# Altium footprint library ICs And Semiconductors SMD.PcbLib: 943 footprints (part 14 of 60)
Each footprint in its own frame and in the unit in brackets; x right, y up, seen from the top. Pads: shape width x height; smd on the part's side, far side on the other; paste and mask are expansions set on the pad; w line width, h text height; cw(c..) or ccw(c..) is an arc to the next point about the centre after c.
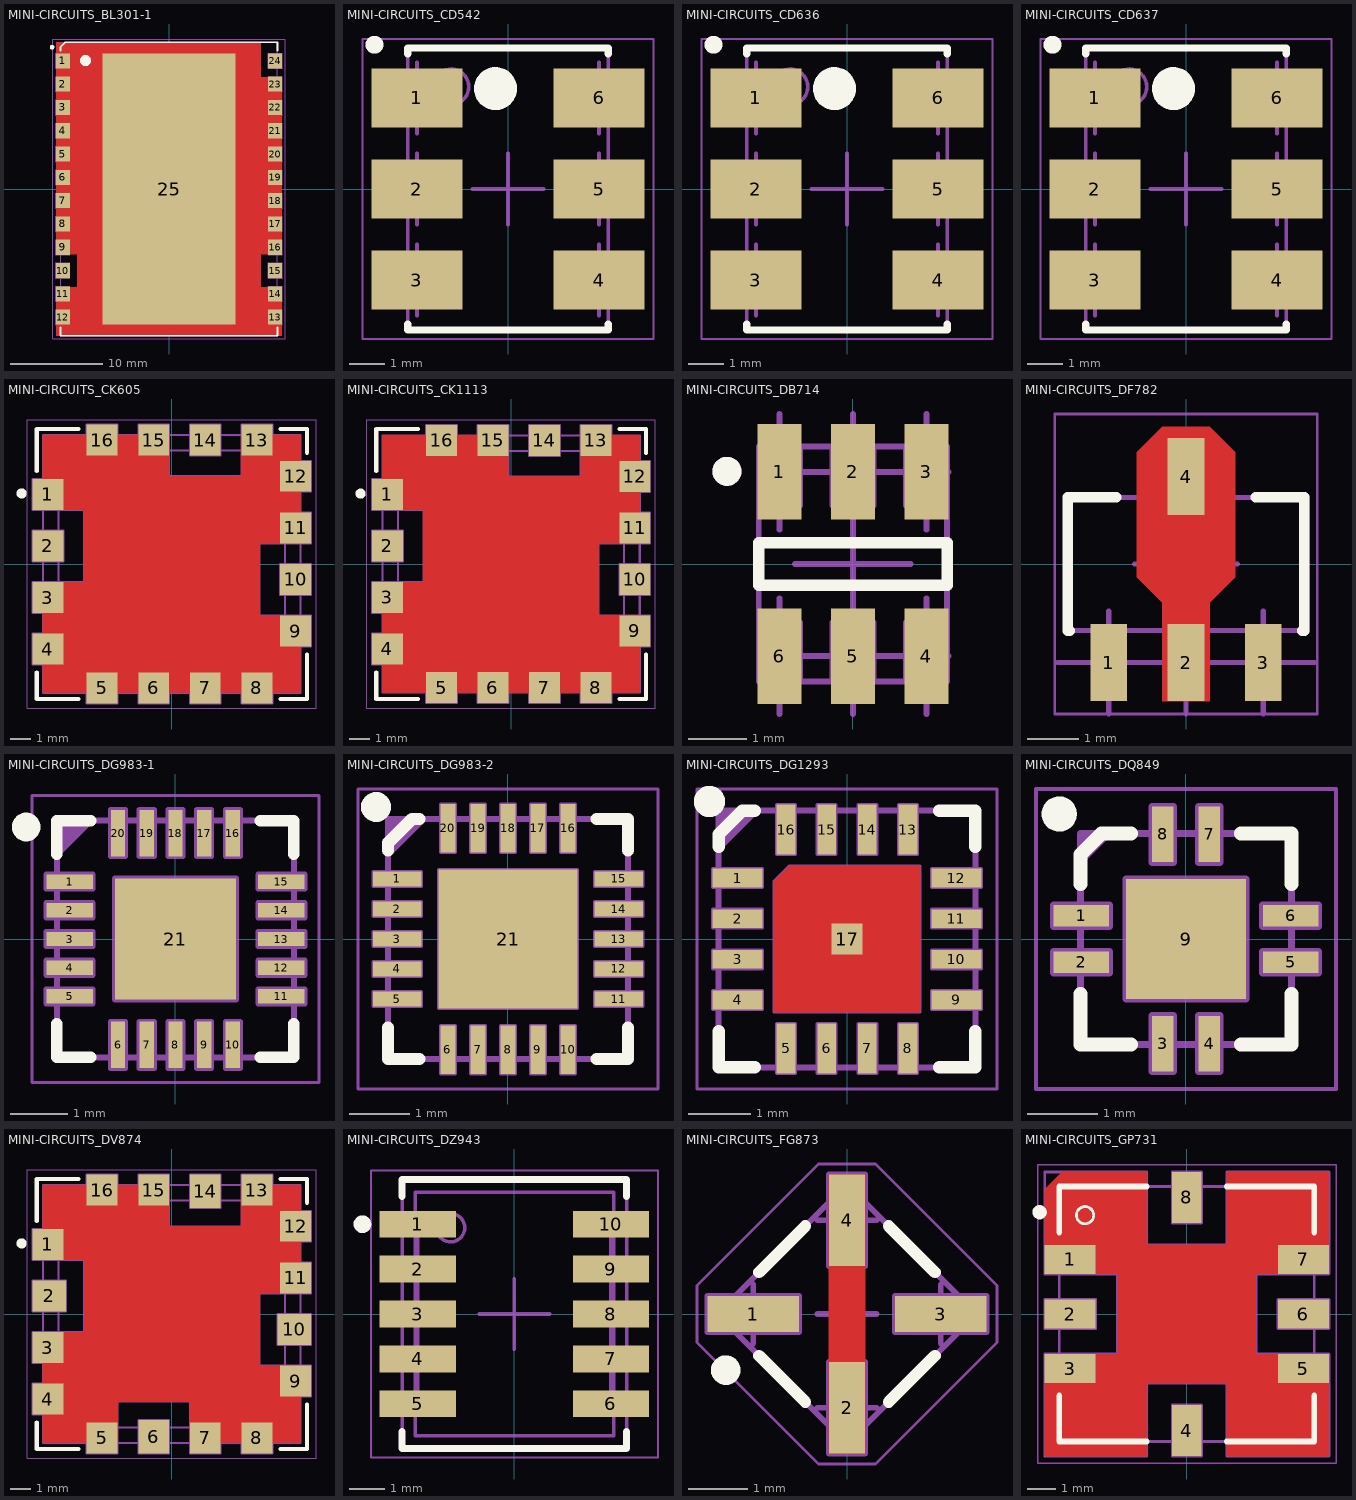
[diagram p13: the footprints below, top view; thin cyan lines are the x and y axes]

## MINI-CIRCUITS_BL301-1 [mm] "MINI-CIRCUITS BL301-1 Case, 2.54mm pitch; 25 pin, 23.62mm W X 32mm L"
height 9.91
pads (25):
  rect 1.52x1.65 smd: 1(-11.56,13.97) 2(-11.56,11.43) 3(-11.56,8.89) 4(-11.56,6.35) 5(-11.56,3.81) 6(-11.56,1.27) 7(-11.56,-1.27) 8(-11.56,-3.81) 9(-11.56,-6.35) 10(-11.56,-8.89) 11(-11.56,-11.43) 12(-11.56,-13.97) 13(11.56,-13.97) 14(11.56,-11.43) 15(11.56,-8.89) 16(11.56,-6.35) 17(11.56,-3.81) 18(11.56,-1.27) 19(11.56,1.27) 20(11.56,3.81) 21(11.56,6.35) 22(11.56,8.89) 23(11.56,11.43) 24(11.56,13.97)
  rect 14.48x29.59 smd: 25(0,0)
Top Layer:
  region: -12.3,16 -12.3,-7.1 -10,-7.1 -10,-10.7 -12.3,-10.7 -12.3,-16 12.3,-16 12.3,-10.7 10,-10.7 10,-7.1 12.3,-7.1 12.3,12.2 10,12.2 10,16
Top Overlay:
  circle w0.25: c-12.745,15.455 r0.125
  circle w0.6: c-9.1,14 r0.3
  lines w0.2: -11.81,-15.095 -11.81,-16 11.81,-16 11.81,-15.095 ; -11.81,15.095 -11.81,15.5 -11.31,16 11.81,16 11.81,15.095
Mechanical 8:
  drawing of 154 lines, arcs and shapes, not listed
Mechanical 14:
  circle w0.1: c-9.1,14 r0.5
  lines w0.1: -11.81,-16 11.81,-16 11.81,16 -11.81,16 -11.81,-16
Mechanical 15:
  lines w0.1: -12.67,-16.35 12.67,-16.35 12.67,16.35 -12.67,16.35 -12.67,-16.35
3D body "MINI-CIRCUITS_BL301-1.stp": height 9.91, standoff 0, extent -11.81,-16 11.81,16

## MINI-CIRCUITS_CD542 [mm] "MINI-CIRCUITS CD542 Case, 2.54mm pitch; 6 pin, 5.59mm W X 7.87mm L"
height 2.84
pads (6):
  rect 2.54x1.65 smd: 1(-2.54,2.54) 2(-2.54,0) 3(-2.54,-2.54) 4(2.54,-2.54) 5(2.54,0) 6(2.54,2.54)
Top Overlay:
  circle w0.25: c-3.725,4.025 r0.125
  circle w0.6: c-0.35,2.8 r0.3
  lines w0.2: -2.795,-3.765 -2.795,-3.935 2.795,-3.935 2.795,-3.765 ; -2.795,3.765 -2.795,3.935 2.795,3.935 2.795,3.765
Mechanical 8:
  lines w0.1: -3.54,-2.54 -2.54,-2.54 ; -3.54,0 -2.54,0 ; -3.54,2.54 -2.54,2.54 ; -2.54,-3.54 -2.54,-2.54 ; -2.54,-1.54 -2.54,-2.54 ; -2.54,-1 -2.54,0 ; -2.54,1 -2.54,0 ; -2.54,1.54 -2.54,2.54 ; -2.54,3.54 -2.54,2.54 ; -1.54,-2.54 -2.54,-2.54 ; -1.54,0 -2.54,0 ; -1.54,2.54 -2.54,2.54 ; -1,0 0,0 ; 0,-1 0,0 ; 0,1 0,0 ; 1,0 0,0 ; 1.54,-2.54 2.54,-2.54 ; 1.54,0 2.54,0 ; 1.54,2.54 2.54,2.54 ; 2.54,-3.54 2.54,-2.54 ; 2.54,-1.54 2.54,-2.54 ; 2.54,-1 2.54,0 ; 2.54,1 2.54,0 ; 2.54,1.54 2.54,2.54 ; 2.54,3.54 2.54,2.54 ; 3.54,-2.54 2.54,-2.54 ; 3.54,0 2.54,0 ; 3.54,2.54 2.54,2.54
Mechanical 14:
  circle w0.1: c-1.595,2.85 r0.5
  lines w0.1: -2.795,-3.935 -2.795,3.935 2.795,3.935 2.795,-3.935 -2.795,-3.935
Mechanical 15:
  lines w0.05: -0.5,0 0.5,0 ; 0,-0.5 0,0.5 ; -4.06,-4.185 4.06,-4.185 4.06,4.185 -4.06,4.185 -4.06,-4.185
3D body "MINI-CIRCUITS_CD542.stp": height 2.84, standoff 0, extent -3.455,-3.935 3.455,3.935

## MINI-CIRCUITS_CD636 [mm] "MINI-CIRCUITS CD636 Case, 2.54mm pitch; 6 pin, 5.59mm W X 7.87mm L"
height 4.11
pads (6):
  rect 2.54x1.65 smd: 1(-2.54,2.54) 2(-2.54,0) 3(-2.54,-2.54) 4(2.54,-2.54) 5(2.54,0) 6(2.54,2.54)
Top Overlay:
  circle w0.25: c-3.725,4.025 r0.125
  circle w0.6: c-0.35,2.8 r0.3
  lines w0.2: -2.795,-3.765 -2.795,-3.935 2.795,-3.935 2.795,-3.765 ; -2.795,3.765 -2.795,3.935 2.795,3.935 2.795,3.765
Mechanical 8:
  lines w0.1: -3.54,-2.54 -2.54,-2.54 ; -3.54,0 -2.54,0 ; -3.54,2.54 -2.54,2.54 ; -2.54,-3.54 -2.54,-2.54 ; -2.54,-1.54 -2.54,-2.54 ; -2.54,-1 -2.54,0 ; -2.54,1 -2.54,0 ; -2.54,1.54 -2.54,2.54 ; -2.54,3.54 -2.54,2.54 ; -1.54,-2.54 -2.54,-2.54 ; -1.54,0 -2.54,0 ; -1.54,2.54 -2.54,2.54 ; -1,0 0,0 ; 0,-1 0,0 ; 0,1 0,0 ; 1,0 0,0 ; 1.54,-2.54 2.54,-2.54 ; 1.54,0 2.54,0 ; 1.54,2.54 2.54,2.54 ; 2.54,-3.54 2.54,-2.54 ; 2.54,-1.54 2.54,-2.54 ; 2.54,-1 2.54,0 ; 2.54,1 2.54,0 ; 2.54,1.54 2.54,2.54 ; 2.54,3.54 2.54,2.54 ; 3.54,-2.54 2.54,-2.54 ; 3.54,0 2.54,0 ; 3.54,2.54 2.54,2.54
Mechanical 14:
  circle w0.1: c-1.595,2.85 r0.5
  lines w0.1: -2.795,-3.935 -2.795,3.935 2.795,3.935 2.795,-3.935 -2.795,-3.935
Mechanical 15:
  lines w0.05: -0.5,0 0.5,0 ; 0,-0.5 0,0.5 ; -4.06,-4.185 4.06,-4.185 4.06,4.185 -4.06,4.185 -4.06,-4.185
3D body "MINI-CIRCUITS_CD636.stp": height 4.11, standoff 0, extent -3.455,-3.935 3.455,3.935

## MINI-CIRCUITS_CD637 [mm] "MINI-CIRCUITS CD637 Case, 2.54mm pitch; 6 pin, 5.59mm W X 7.87mm L"
height 5.23
pads (6):
  rect 2.54x1.65 smd: 1(-2.54,2.54) 2(-2.54,0) 3(-2.54,-2.54) 4(2.54,-2.54) 5(2.54,0) 6(2.54,2.54)
Top Overlay:
  circle w0.25: c-3.725,4.025 r0.125
  circle w0.6: c-0.35,2.8 r0.3
  lines w0.2: -2.795,-3.765 -2.795,-3.935 2.795,-3.935 2.795,-3.765 ; -2.795,3.765 -2.795,3.935 2.795,3.935 2.795,3.765
Mechanical 8:
  lines w0.1: -3.54,-2.54 -2.54,-2.54 ; -3.54,0 -2.54,0 ; -3.54,2.54 -2.54,2.54 ; -2.54,-3.54 -2.54,-2.54 ; -2.54,-1.54 -2.54,-2.54 ; -2.54,-1 -2.54,0 ; -2.54,1 -2.54,0 ; -2.54,1.54 -2.54,2.54 ; -2.54,3.54 -2.54,2.54 ; -1.54,-2.54 -2.54,-2.54 ; -1.54,0 -2.54,0 ; -1.54,2.54 -2.54,2.54 ; -1,0 0,0 ; 0,-1 0,0 ; 0,1 0,0 ; 1,0 0,0 ; 1.54,-2.54 2.54,-2.54 ; 1.54,0 2.54,0 ; 1.54,2.54 2.54,2.54 ; 2.54,-3.54 2.54,-2.54 ; 2.54,-1.54 2.54,-2.54 ; 2.54,-1 2.54,0 ; 2.54,1 2.54,0 ; 2.54,1.54 2.54,2.54 ; 2.54,3.54 2.54,2.54 ; 3.54,-2.54 2.54,-2.54 ; 3.54,0 2.54,0 ; 3.54,2.54 2.54,2.54
Mechanical 14:
  circle w0.1: c-1.595,2.85 r0.5
  lines w0.1: -2.795,-3.935 -2.795,3.935 2.795,3.935 2.795,-3.935 -2.795,-3.935
Mechanical 15:
  lines w0.05: -0.5,0 0.5,0 ; 0,-0.5 0,0.5 ; -4.06,-4.185 4.06,-4.185 4.06,4.185 -4.06,4.185 -4.06,-4.185
3D body "MINI-CIRCUITS_CD637.stp": height 5.23, standoff 0, extent -3.455,-3.935 3.455,3.935

## MINI-CIRCUITS_CK605 [mm] "MINI-CIRCUITS CK605 Case, 2.54mm pitch; 16 pins, Body 12.7mm W X 12.7mm L X 4.57mm H"
height 4.57
pads (16):
  rect 1.52x1.52 smd: 1(-6.1,3.43) 2(-6.1,0.89) 3(-6.1,-1.65) 4(-6.1,-4.19) 5(-3.43,-6.1) 6(-0.89,-6.1) 7(1.65,-6.1) 8(4.19,-6.1) 9(6.1,-3.3) 10(6.1,-0.76) 11(6.1,1.78) 12(6.1,4.32) 13(4.19,6.1) 14(1.65,6.1) 15(-0.89,6.1) 16(-3.43,6.1)
Top Layer:
  region: -6.35,-0.89 -4.324,-0.89 -4.324,2.67 -6.35,2.67 -6.35,6.35 -0.13,6.35 -0.13,4.324 3.43,4.324 3.43,6.35 6.35,6.35 6.35,1.02 4.324,1.02 4.324,-2.54 6.35,-2.54 6.35,-6.35 -6.35,-6.35
Top Overlay:
  circle w0.25: c-7.4,3.475 r0.125
  lines w0.2: -6.65,-5.35 -6.65,-6.65 -4.59,-6.65 ; -6.65,4.59 -6.65,6.65 -4.59,6.65 ; 5.35,-6.65 6.65,-6.65 6.65,-4.46 ; 5.35,6.65 6.65,6.65 6.65,5.48
Mechanical 8:
  lines w0.1: -6.6,-4.19 -6.1,-4.19 ; -6.6,-1.65 -6.1,-1.65 ; -6.6,0.89 -6.1,0.89 ; -6.6,3.43 -6.1,3.43 ; -6.1,-4.69 -6.1,-4.19 ; -6.1,-3.69 -6.1,-4.19 ; -6.1,-2.15 -6.1,-1.65 ; -6.1,-1.15 -6.1,-1.65 ; -6.1,0.39 -6.1,0.89 ; -6.1,1.39 -6.1,0.89 ; -6.1,2.93 -6.1,3.43 ; -6.1,3.93 -6.1,3.43 ; -5.6,-4.19 -6.1,-4.19 ; -5.6,-1.65 -6.1,-1.65 ; -5.6,0.89 -6.1,0.89 ; -5.6,3.43 -6.1,3.43 ; -3.93,-6.1 -3.43,-6.1 ; -3.93,6.1 -3.43,6.1 ; -3.43,-6.6 -3.43,-6.1 ; -3.43,-5.6 -3.43,-6.1 ; -3.43,5.6 -3.43,6.1 ; -3.43,6.6 -3.43,6.1 ; -2.93,-6.1 -3.43,-6.1 ; -2.93,6.1 -3.43,6.1 ; -1.39,-6.1 -0.89,-6.1 ; -1.39,6.1 -0.89,6.1 ; -0.89,-6.6 -0.89,-6.1 ; -0.89,-5.6 -0.89,-6.1 ; -0.89,5.6 -0.89,6.1 ; -0.89,6.6 -0.89,6.1 ; -0.5,0 0,0 ; -0.39,-6.1 -0.89,-6.1 ; -0.39,6.1 -0.89,6.1 ; 0,-0.5 0,0 ; 0,0.5 0,0 ; 0.5,0 0,0 ; 1.15,-6.1 1.65,-6.1 ; 1.15,6.1 1.65,6.1 ; 1.65,-6.6 1.65,-6.1 ; 1.65,-5.6 1.65,-6.1 ; 1.65,5.6 1.65,6.1 ; 1.65,6.6 1.65,6.1 ; 2.15,-6.1 1.65,-6.1 ; 2.15,6.1 1.65,6.1 ; 3.69,-6.1 4.19,-6.1 ; 3.69,6.1 4.19,6.1 ; 4.19,-6.6 4.19,-6.1 ; 4.19,-5.6 4.19,-6.1 ; 4.19,5.6 4.19,6.1 ; 4.19,6.6 4.19,6.1 ; 4.69,-6.1 4.19,-6.1 ; 4.69,6.1 4.19,6.1 ; 5.6,-3.3 6.1,-3.3 ; 5.6,-0.76 6.1,-0.76 ; 5.6,1.78 6.1,1.78 ; 5.6,4.32 6.1,4.32 ; 6.1,-3.8 6.1,-3.3 ; 6.1,-2.8 6.1,-3.3 ; 6.1,-1.26 6.1,-0.76 ; 6.1,-0.26 6.1,-0.76 ; 6.1,1.28 6.1,1.78 ; 6.1,2.28 6.1,1.78 ; 6.1,3.82 6.1,4.32 ; 6.1,4.82 6.1,4.32 ; 6.6,-3.3 6.1,-3.3 ; 6.6,-0.76 6.1,-0.76 ; 6.6,1.78 6.1,1.78 ; 6.6,4.32 6.1,4.32 ; -6.86,-4.95 -5.34,-4.95 -5.34,-3.43 -6.86,-3.43 -6.86,-4.95 ; -6.86,-2.41 -5.34,-2.41 -5.34,-0.89 -6.86,-0.89 -6.86,-2.41 ; -6.86,0.13 -5.34,0.13 -5.34,1.65 -6.86,1.65 -6.86,0.13 ; -6.86,2.67 -5.34,2.67 -5.34,4.19 -6.86,4.19 -6.86,2.67 ; -6.35,-6.35 -6.35,-0.89 -4.324,-0.89 -4.324,2.67 -6.35,2.67 -6.35,6.35 -0.13,6.35 -0.13,4.324 3.43,4.324 3.43,6.35 6.35,6.35 6.35,1.02 4.324,1.02 4.324,-2.54 6.35,-2.54 6.35,-6.35 -6.35,-6.35 ; -4.19,-6.86 -2.67,-6.86 -2.67,-5.34 -4.19,-5.34 -4.19,-6.86 ; -4.19,5.34 -2.67,5.34 -2.67,6.86 -4.19,6.86 -4.19,5.34 ; -1.65,-6.86 -0.13,-6.86 -0.13,-5.34 -1.65,-5.34 -1.65,-6.86 ; -1.65,5.34 -0.13,5.34 -0.13,6.86 -1.65,6.86 -1.65,5.34 ; 0.89,-6.86 2.41,-6.86 2.41,-5.34 0.89,-5.34 0.89,-6.86 ; 0.89,5.34 2.41,5.34 2.41,6.86 0.89,6.86 0.89,5.34 ; 3.43,-6.86 4.95,-6.86 4.95,-5.34 3.43,-5.34 3.43,-6.86 ; 3.43,5.34 4.95,5.34 4.95,6.86 3.43,6.86 3.43,5.34 ; 5.34,-4.06 6.86,-4.06 6.86,-2.54 5.34,-2.54 5.34,-4.06 ; 5.34,-1.52 6.86,-1.52 6.86,0 5.34,0 5.34,-1.52 ; 5.34,1.02 6.86,1.02 6.86,2.54 5.34,2.54 5.34,1.02 ; 5.34,3.56 6.86,3.56 6.86,5.08 5.34,5.08 5.34,3.56
Mechanical 14:
  circle w0.1: c-4.28,4.28 r0.5
  lines w0.1: -6.35,-6.35 -6.35,-4.71 ccw(c-6.65,-4.19) -6.35,-3.67 -6.35,-2.17 ccw(c-6.65,-1.65) -6.35,-1.13 -6.35,0.37 ccw(c-6.65,0.89) -6.35,1.41 -6.35,2.91 ccw(c-6.65,3.43) -6.35,3.95 -6.35,6.35 -3.95,6.35 ccw(c-3.43,6.65) -2.91,6.35 -1.41,6.35 ccw(c-0.89,6.65) -0.37,6.35 1.13,6.35 ccw(c1.65,6.65) 2.17,6.35 3.67,6.35 ccw(c4.19,6.65) 4.71,6.35 6.35,6.35 6.35,4.84 ccw(c6.65,4.32) 6.35,3.8 6.35,2.3 ccw(c6.65,1.78) 6.35,1.26 6.35,-0.24 ccw(c6.65,-0.76) 6.35,-1.28 6.35,-2.78 ccw(c6.65,-3.3) 6.35,-3.82 6.35,-6.35 4.71,-6.35 ccw(c4.19,-6.65) 3.67,-6.35 2.17,-6.35 ccw(c1.65,-6.65) 1.13,-6.35 -0.37,-6.35 ccw(c-0.89,-6.65) -1.41,-6.35 -2.91,-6.35 ccw(c-3.43,-6.65) -3.95,-6.35 -6.35,-6.35 ; -5.58,-5.28 ccw(c-5.28,-5.28) -5.28,-5.58 5.28,-5.58 ccw(c5.28,-5.28) 5.58,-5.28 5.58,5.28 ccw(c5.28,5.28) 5.28,5.58 -5.28,5.58 ccw(c-5.28,5.28) -5.58,5.28 -5.58,-5.28
Mechanical 15:
  lines w0.05: -7.11,-7.11 7.11,-7.11 7.11,7.11 -7.11,7.11 -7.11,-7.11
3D body "MINI-CIRCUITS_CK605.stp": height 4.57, standoff 0, extent -6.35,-6.35 6.35,6.35

## MINI-CIRCUITS_CK1113 [mm] "MINI-CIRCUITS CK1113 Case, 2.54mm pitch; 12 pins, Body 12.7mm W X 12.7mm L X 5.59 H"
height 5.59
pads (16):
  rect 1.52x1.52 smd: 1(-6.1,3.43) 2(-6.1,0.89) 3(-6.1,-1.65) 4(-6.1,-4.19) 5(-3.43,-6.1) 6(-0.89,-6.1) 7(1.65,-6.1) 8(4.19,-6.1) 9(6.1,-3.3) 10(6.1,-0.76) 11(6.1,1.78) 12(6.1,4.32) 13(4.19,6.1) 14(1.65,6.1) 15(-0.89,6.1) 16(-3.43,6.1)
Top Layer:
  region: -6.35,-0.89 -4.324,-0.89 -4.324,2.67 -6.35,2.67 -6.35,6.35 -0.13,6.35 -0.13,4.324 3.43,4.324 3.43,6.35 6.35,6.35 6.35,1.02 4.324,1.02 4.324,-2.54 6.35,-2.54 6.35,-6.35 -6.35,-6.35
Top Overlay:
  circle w0.25: c-7.425,3.475 r0.125
  lines w0.2: -6.65,-5.35 -6.65,-6.65 -4.59,-6.65 ; -6.65,4.59 -6.65,6.65 -4.59,6.65 ; 5.35,-6.65 6.65,-6.65 6.65,-4.46 ; 5.35,6.65 6.65,6.65 6.65,5.48
Mechanical 8:
  lines w0.1: -6.6,-4.19 -6.1,-4.19 ; -6.6,-1.65 -6.1,-1.65 ; -6.6,0.89 -6.1,0.89 ; -6.6,3.43 -6.1,3.43 ; -6.1,-4.69 -6.1,-4.19 ; -6.1,-3.69 -6.1,-4.19 ; -6.1,-2.15 -6.1,-1.65 ; -6.1,-1.15 -6.1,-1.65 ; -6.1,0.39 -6.1,0.89 ; -6.1,1.39 -6.1,0.89 ; -6.1,2.93 -6.1,3.43 ; -6.1,3.93 -6.1,3.43 ; -5.6,-4.19 -6.1,-4.19 ; -5.6,-1.65 -6.1,-1.65 ; -5.6,0.89 -6.1,0.89 ; -5.6,3.43 -6.1,3.43 ; -3.93,-6.1 -3.43,-6.1 ; -3.93,6.1 -3.43,6.1 ; -3.43,-6.6 -3.43,-6.1 ; -3.43,-5.6 -3.43,-6.1 ; -3.43,5.6 -3.43,6.1 ; -3.43,6.6 -3.43,6.1 ; -2.93,-6.1 -3.43,-6.1 ; -2.93,6.1 -3.43,6.1 ; -1.39,-6.1 -0.89,-6.1 ; -1.39,6.1 -0.89,6.1 ; -0.89,-6.6 -0.89,-6.1 ; -0.89,-5.6 -0.89,-6.1 ; -0.89,5.6 -0.89,6.1 ; -0.89,6.6 -0.89,6.1 ; -0.5,0 0,0 ; -0.39,-6.1 -0.89,-6.1 ; -0.39,6.1 -0.89,6.1 ; 0,-0.5 0,0 ; 0,0.5 0,0 ; 0.5,0 0,0 ; 1.15,-6.1 1.65,-6.1 ; 1.15,6.1 1.65,6.1 ; 1.65,-6.6 1.65,-6.1 ; 1.65,-5.6 1.65,-6.1 ; 1.65,5.6 1.65,6.1 ; 1.65,6.6 1.65,6.1 ; 2.15,-6.1 1.65,-6.1 ; 2.15,6.1 1.65,6.1 ; 3.69,-6.1 4.19,-6.1 ; 3.69,6.1 4.19,6.1 ; 4.19,-6.6 4.19,-6.1 ; 4.19,-5.6 4.19,-6.1 ; 4.19,5.6 4.19,6.1 ; 4.19,6.6 4.19,6.1 ; 4.69,-6.1 4.19,-6.1 ; 4.69,6.1 4.19,6.1 ; 5.6,-3.3 6.1,-3.3 ; 5.6,-0.76 6.1,-0.76 ; 5.6,1.78 6.1,1.78 ; 5.6,4.32 6.1,4.32 ; 6.1,-3.8 6.1,-3.3 ; 6.1,-2.8 6.1,-3.3 ; 6.1,-1.26 6.1,-0.76 ; 6.1,-0.26 6.1,-0.76 ; 6.1,1.28 6.1,1.78 ; 6.1,2.28 6.1,1.78 ; 6.1,3.82 6.1,4.32 ; 6.1,4.82 6.1,4.32 ; 6.6,-3.3 6.1,-3.3 ; 6.6,-0.76 6.1,-0.76 ; 6.6,1.78 6.1,1.78 ; 6.6,4.32 6.1,4.32 ; -6.86,-4.95 -6.86,-3.43 -5.34,-3.43 -5.34,-4.95 -6.86,-4.95 ; -6.86,-2.41 -6.86,-0.89 -5.34,-0.89 -5.34,-2.41 -6.86,-2.41 ; -6.86,0.13 -6.86,1.65 -5.34,1.65 -5.34,0.13 -6.86,0.13 ; -6.86,2.67 -6.86,4.19 -5.34,4.19 -5.34,2.67 -6.86,2.67 ; -6.35,-6.35 6.35,-6.35 6.35,-2.54 4.324,-2.54 4.324,1.02 6.35,1.02 6.35,6.35 3.43,6.35 3.43,4.324 -0.13,4.324 -0.13,6.35 -6.35,6.35 -6.35,2.67 -4.324,2.67 -4.324,-0.89 -6.35,-0.89 -6.35,-6.35 ; -4.19,-6.86 -4.19,-5.34 -2.67,-5.34 -2.67,-6.86 -4.19,-6.86 ; -4.19,5.34 -4.19,6.86 -2.67,6.86 -2.67,5.34 -4.19,5.34 ; -1.65,-6.86 -1.65,-5.34 -0.13,-5.34 -0.13,-6.86 -1.65,-6.86 ; -1.65,5.34 -1.65,6.86 -0.13,6.86 -0.13,5.34 -1.65,5.34 ; 0.89,-6.86 0.89,-5.34 2.41,-5.34 2.41,-6.86 0.89,-6.86 ; 0.89,5.34 0.89,6.86 2.41,6.86 2.41,5.34 0.89,5.34 ; 3.43,-6.86 3.43,-5.34 4.95,-5.34 4.95,-6.86 3.43,-6.86 ; 3.43,5.34 3.43,6.86 4.95,6.86 4.95,5.34 3.43,5.34 ; 5.34,-4.06 5.34,-2.54 6.86,-2.54 6.86,-4.06 5.34,-4.06 ; 5.34,-1.52 5.34,0 6.86,0 6.86,-1.52 5.34,-1.52 ; 5.34,1.02 5.34,2.54 6.86,2.54 6.86,1.02 5.34,1.02 ; 5.34,3.56 5.34,5.08 6.86,5.08 6.86,3.56 5.34,3.56
Mechanical 14:
  circle w0.1: c-4.28,4.28 r0.5
  lines w0.1: -6.35,-6.35 -3.95,-6.35 cw(c-3.43,-6.65) -2.91,-6.35 -1.41,-6.35 cw(c-0.89,-6.65) -0.37,-6.35 1.13,-6.35 cw(c1.65,-6.65) 2.17,-6.35 3.67,-6.35 cw(c4.19,-6.65) 4.71,-6.35 6.35,-6.35 6.35,-3.82 cw(c6.65,-3.3) 6.35,-2.78 6.35,-1.28 cw(c6.65,-0.76) 6.35,-0.24 6.35,1.26 cw(c6.65,1.78) 6.35,2.3 6.35,3.8 cw(c6.65,4.32) 6.35,4.84 6.35,6.35 4.71,6.35 cw(c4.19,6.65) 3.67,6.35 2.17,6.35 cw(c1.65,6.65) 1.13,6.35 -0.37,6.35 cw(c-0.89,6.65) -1.41,6.35 -2.91,6.35 cw(c-3.43,6.65) -3.95,6.35 -6.35,6.35 -6.35,3.95 cw(c-6.65,3.43) -6.35,2.91 -6.35,1.41 cw(c-6.65,0.89) -6.35,0.37 -6.35,-1.13 cw(c-6.65,-1.65) -6.35,-2.17 -6.35,-3.67 cw(c-6.65,-4.19) -6.35,-4.71 -6.35,-6.35 ; -5.58,-5.28 ccw(c-5.28,-5.28) -5.28,-5.58 5.28,-5.58 ccw(c5.28,-5.28) 5.58,-5.28 5.58,5.28 ccw(c5.28,5.28) 5.28,5.58 -5.28,5.58 ccw(c-5.28,5.28) -5.58,5.28 -5.58,-5.28
Mechanical 15:
  lines w0.05: -7.11,-7.11 -7.11,7.11 7.11,7.11 7.11,-7.11 -7.11,-7.11
3D body "MINI-CIRCUITS_CK1113.stp": height 5.59, standoff 0, extent -6.35,-6.35 6.35,6.35

## MINI-CIRCUITS_DB714 [mm] "MINI-CIRCUITS Case Style DB714 - Body 4.06X3.81mm"
height 4.06
pads (6):
  rect 0.76x1.65 smd: 1(-1.27,1.59) 2(0,1.59) 3(1.27,1.59) 4(1.27,-1.59) 5(0,-1.59) 6(-1.27,-1.59)
Top Overlay:
  circle w0.25: c-2.175,1.6 r0.125
  lines w0.2: -1.625,-0.365 -1.625,0.365 1.625,0.365 1.625,-0.365 -1.625,-0.365
Mechanical 8:
  lines w0.1: -1.27,-2.59 -1.27,-1.59 ; -1.27,-0.59 -1.27,-1.59 ; -1.27,0.59 -1.27,1.59 ; -1.27,2.59 -1.27,1.59 ; -1,0 0,0 ; 0,-2.59 0,-1.59 0,-0.59 ; 0,-1 0,0 ; 0,0.59 0,1.59 0,2.59 ; 0,1 0,0 ; 1,0 0,0 ; 1.27,-2.59 1.27,-1.59 1.27,-0.59 ; 1.27,0.59 1.27,1.59 1.27,2.59 ; 1.65,-1.59 -1.27,-1.59 ; 1.65,1.59 -1.27,1.59
Mechanical 14:
  circle w0.25: c-2.175,1.6 r0.125
  lines w0.1: -1.625,-2.03 -0.915,-2.03 -0.915,-1.01 -1.625,-1.01 -1.625,-2.03 ; -1.625,-2.03 -1.625,2.03 ; -1.625,-2.03 1.625,-2.03 ; -1.625,2.03 -0.915,2.03 -0.915,1.01 -1.625,1.01 -1.625,2.03 ; -1.625,2.03 1.625,2.03 ; 1.625,-2.03 1.625,-1.01 0.915,-1.01 0.915,-2.03 1.625,-2.03 ; 1.625,-2.03 1.625,2.03 ; 1.625,2.03 0.915,2.03 0.915,1.01 1.625,1.01 1.625,2.03 ; -0.355,-2.03 0.355,-2.03 0.355,-1.01 -0.355,-1.01 -0.355,-2.03 ; -0.355,1.01 0.355,1.01 0.355,2.03 -0.355,2.03 -0.355,1.01
3D body "MINI-CIRCUITS_DB714.stp": height 3.76, standoff 0, extent -1.625,-2.03 1.625,2.03
